# Altium footprint library IC.PcbLib: 115 footprints (part 7 of 8)
Each footprint in its own frame and in the unit in brackets; x right, y up, seen from the top. Pads: shape width x height; smd on the part's side, far side on the other; paste and mask are expansions set on the pad; w line width, h text height; cw(c..) or ccw(c..) is an arc to the next point about the centre after c.
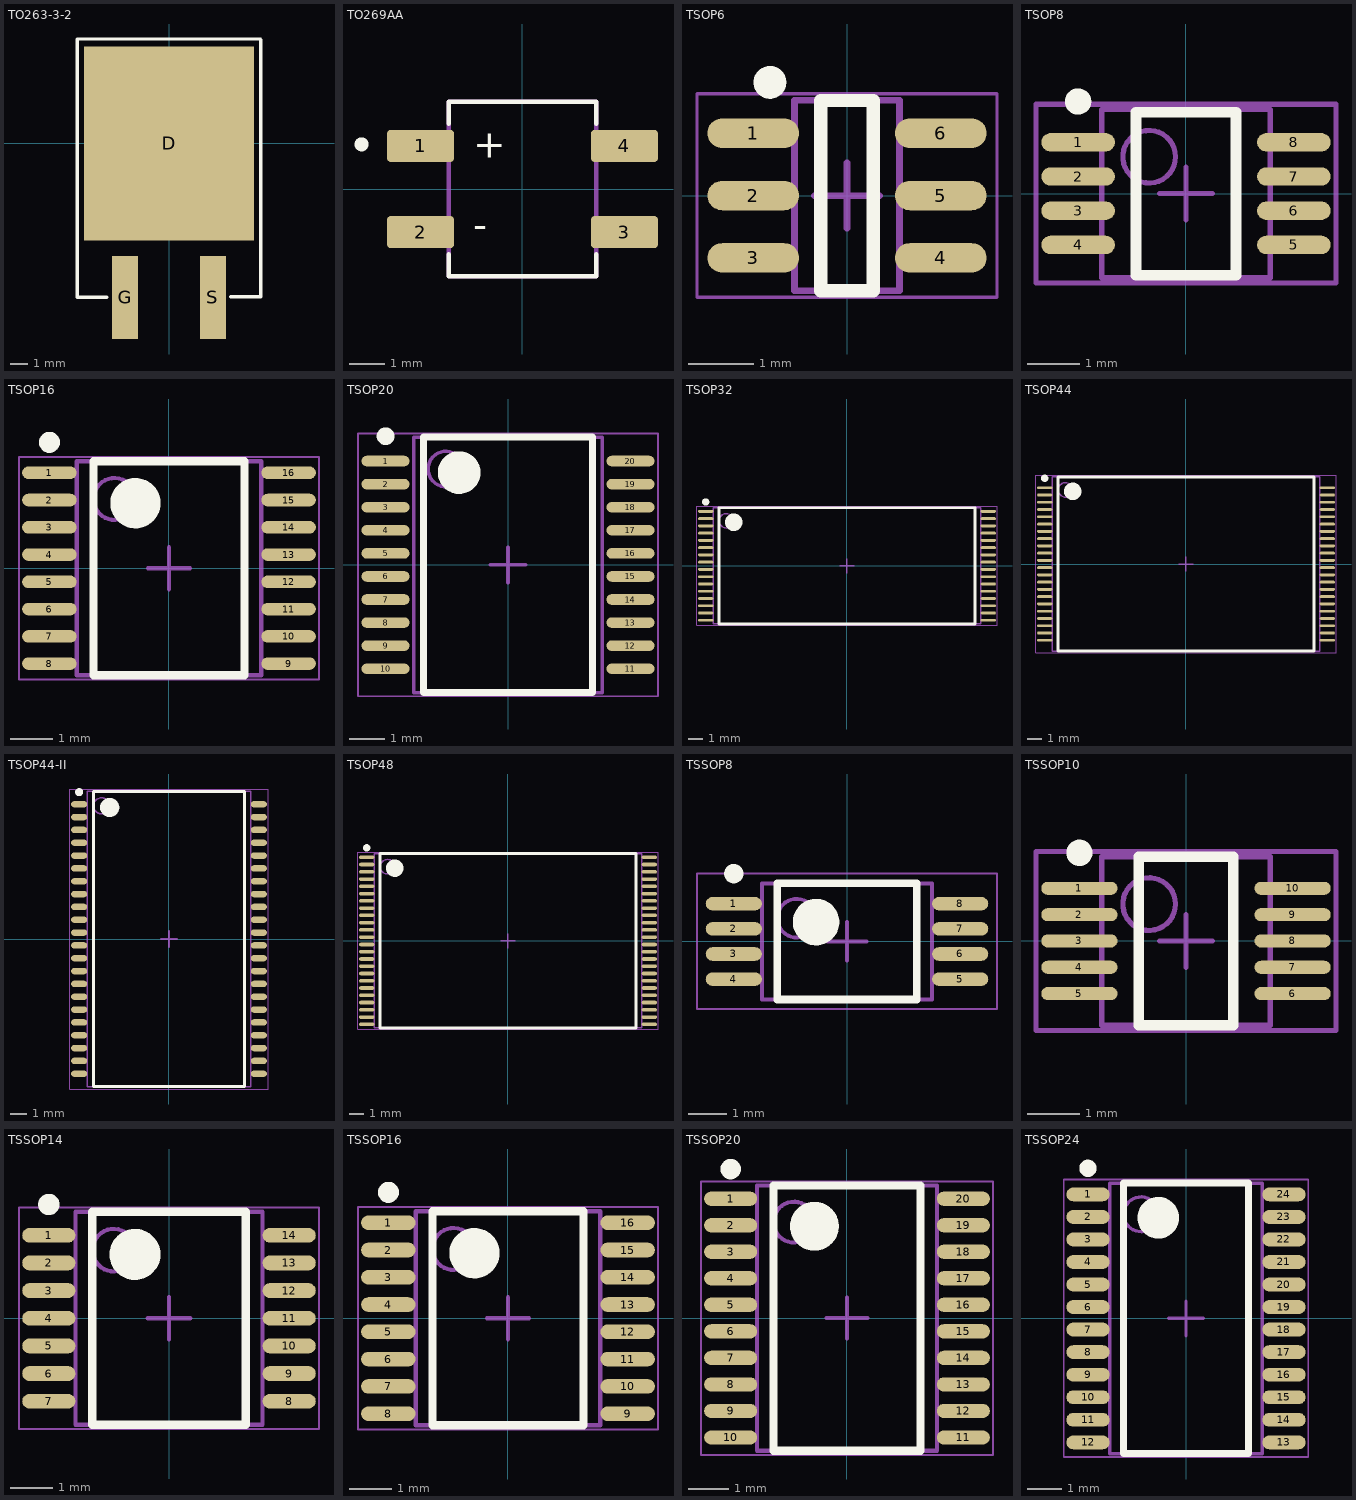
[diagram p6: the footprints below, top view; thin cyan lines are the x and y axes]

## TO263-3-2 [mm]
pads (3):
  rect 9.8x11.2 smd: D(0,0)
  rect 1.524x4.8 smd: G(-2.54,-8.9) S(2.54,-8.9)
Top Overlay:
  lines w0.2: -3.581,-8.89 -5.292,-8.89 -5.292,6.02 5.258,6.02 5.292,5.986 5.292,-8.865 3.573,-8.865
3D body "IRF740S.STEP": height 4.93, standoff -0.03, extent -5.131,-9.982 5.029,5.258

## TO269AA [mm]
pads (4):
  rrect23% 1.91x0.91 smd: 1(-2.9,1.225) 2(-2.9,-1.225) 3(2.9,-1.225) 4(2.9,1.225)
Top Overlay:
  circle w0.2: c-4.58,1.27 r0.1
  lines w0.127: -2.1,-1.86 -2.1,-2.48 2.1,-2.48 2.1,-1.86 ; -2.1,1.86 -2.1,2.48 2.1,2.48 2.1,1.86
  text "+" at -1.399,0.89 h0.81
  text "-" at -1.4,-1.4 h0.81
Mechanical 13:
  lines w0.127: -2.1,-2.48 2.1,-2.48 2.1,2.48 -2.1,2.48 -2.1,-2.48
3D body "User Library-TO-269AA_jam.step": height 2.7, standoff 0, extent -3.571,-2.438 3.469,2.512

## TSOP6 [mm] "TSOP, 6-Leads, Body 2.90x1.63mm, Pitch 0.95mm, IPC High Density"
height 1
pads (6):
  oval 1.4x0.45 smd: 1(-1.429,0.95) 2(-1.429,0) 3(-1.429,-0.95) 4(1.429,-0.95) 5(1.429,0) 6(1.429,0.95)
Top Overlay:
  circle w0.25: c-1.175,1.725 r0.125
  lines w0.2: -0.4,-1.45 0.4,-1.45 0.4,1.45 -0.4,1.45 -0.4,-1.45
Mechanical 13:
  lines w0.1: -0.8,-1.45 0.8,-1.45 0.8,1.45 -0.8,1.45 -0.8,-1.45
Mechanical 15:
  lines w0.05: -2.286,-1.55 2.286,-1.55 2.286,1.55 -2.286,1.55 -2.286,-1.55
  lines w0.1: -0.5,0 0.5,0 ; 0,-0.5 0,0.5
3D body "User Library-TSOP6.step": height 1.04, standoff -0.01, extent -1.375,-1.5 1.375,1.5

## TSOP8 [mm] "TSOP, 8-Leads, Body 3x3mm, Pitch 0.65mm, IPC High Density"
height 1.1
pads (8):
  oval 1.4x0.35 smd: 1(-2.05,0.975) 2(-2.05,0.325) 3(-2.05,-0.325) 4(-2.05,-0.975) 5(2.05,-0.975) 6(2.05,-0.325) 7(2.05,0.325) 8(2.05,0.975)
Top Overlay:
  circle w0.25: c-2.05,1.75 r0.125
  lines w0.2: -0.95,-1.55 -0.95,1.55 0.95,1.55 0.95,-1.55 -0.95,-1.55
Mechanical 13:
  circle w0.1: c-0.7,0.7 r0.5
  lines w0.1: -1.6,-1.6 -1.6,1.6 1.6,1.6 1.6,-1.6 -1.6,-1.6
Mechanical 15:
  lines w0.1: -0.5,0 0.5,0 ; 0,-0.5 0,0.5 ; -2.85,-1.7 -2.85,1.7 2.85,1.7 2.85,-1.7 -2.85,-1.7
3D body "TSOP65P470X150-8N.step": height 1.5, standoff 0, extent -2.35,-1.5 2.35,1.5

## TSOP16 [mm] "TSOP, 16-Leads, Body 5.10x4.40mm, Pitch 0.65mm, IPC High Density"
height 1
pads (16):
  oval 1.3x0.3 smd: 1(-2.85,2.275) 2(-2.85,1.625) 3(-2.85,0.975) 4(-2.85,0.325) 5(-2.85,-0.325) 6(-2.85,-0.975) 7(-2.85,-1.625) 8(-2.85,-2.275) 9(2.85,-2.275) 10(2.85,-1.625) 11(2.85,-0.975) 12(2.85,-0.325) 13(2.85,0.325) 14(2.85,0.975) 15(2.85,1.625) 16(2.85,2.275)
Top Overlay:
  circle w0.6: c-0.8,1.55 r0.3
  circle w0.25: c-2.85,3 r0.125
  lines w0.2: -1.8,-2.55 1.8,-2.55 1.8,2.55 -1.8,2.55 -1.8,-2.55
Mechanical 13:
  circle w0.1: c-1.3,1.65 r0.5
  lines w0.1: -2.2,-2.55 2.2,-2.55 2.2,2.55 -2.2,2.55 -2.2,-2.55
Mechanical 15:
  lines w0.05: -3.575,-2.65 3.575,-2.65 3.575,2.65 -3.575,2.65 -3.575,-2.65
  lines w0.1: -0.5,0 0.5,0 ; 0,-0.5 0,0.5
3D body "TSOP65P640X150-16N.step": height 1.5, standoff 0, extent -3.19,-2.6 3.19,2.6

## TSOP20 [mm] "TSOP, 20-Leads, Body 7.20x5.30mm, Pitch 0.65mm, IPC High Density"
height 1
pads (20):
  oval 1.35x0.3 smd: 1(-3.45,2.925) 2(-3.45,2.275) 3(-3.45,1.625) 4(-3.45,0.975) 5(-3.45,0.325) 6(-3.45,-0.325) 7(-3.45,-0.975) 8(-3.45,-1.625) 9(-3.45,-2.275) 10(-3.45,-2.925) 11(3.45,-2.925) 12(3.45,-2.275) 13(3.45,-1.625) 14(3.45,-0.975) 15(3.45,-0.325) 16(3.45,0.325) 17(3.45,0.975) 18(3.45,1.625) 19(3.45,2.275) 20(3.45,2.925)
Top Overlay:
  circle w0.25: c-3.45,3.625 r0.125
  circle w0.6: c-1.375,2.6 r0.3
  lines w0.2: -2.375,-3.6 -2.375,3.6 2.375,3.6 2.375,-3.6 -2.375,-3.6
Mechanical 13:
  circle w0.1: c-1.75,2.7 r0.5
  lines w0.1: -2.65,-3.6 -2.65,3.6 2.65,3.6 2.65,-3.6 -2.65,-3.6
Mechanical 15:
  lines w0.05: -4.225,-3.7 -4.225,3.7 4.225,3.7 4.225,-3.7 -4.225,-3.7
  lines w0.1: -0.5,0 0.5,0 ; 0,-0.5 0,0.5
3D body "TSOP65P770X150-20N.step": height 1.5, standoff 0, extent -3.85,-3.6 3.85,3.6

## TSOP32 [mm] "TSOP, 32-Leads, Body 8.00x18.40mm, Pitch 0.50mm, IPC High Density"
height 1.1
pads (32):
  oval 1.05x0.2 smd: 1(-9.725,3.75) 2(-9.725,3.25) 3(-9.725,2.75) 4(-9.725,2.25) 5(-9.725,1.75) 6(-9.725,1.25) 7(-9.725,0.75) 8(-9.725,0.25) 9(-9.725,-0.25) 10(-9.725,-0.75) 11(-9.725,-1.25) 12(-9.725,-1.75) 13(-9.725,-2.25) 14(-9.725,-2.75) 15(-9.725,-3.25) 16(-9.725,-3.75) 17(9.725,-3.75) 18(9.725,-3.25) 19(9.725,-2.75) 20(9.725,-2.25) 21(9.725,-1.75) 22(9.725,-1.25) 23(9.725,-0.75) 24(9.725,-0.25) 25(9.725,0.25) 26(9.725,0.75) 27(9.725,1.25) 28(9.725,1.75) 29(9.725,2.25) 30(9.725,2.75) 31(9.725,3.25) 32(9.725,3.75)
Top Overlay:
  circle w0.25: c-9.725,4.4 r0.125
  circle w0.6: c-7.8,3 r0.3
  lines w0.2: -8.8,-4 -8.8,4 8.8,4 8.8,-4 -8.8,-4
Mechanical 13:
  circle w0.1: c-8.3,3.1 r0.5
  lines w0.1: -9.2,-4 -9.2,4 9.2,4 9.2,-4 -9.2,-4
Mechanical 15:
  lines w0.05: -10.325,-4.1 -10.325,4.1 10.325,4.1 10.325,-4.1 -10.325,-4.1
  lines w0.1: -0.5,0 0.5,0 ; 0,-0.5 0,0.5
3D body "TSSOP50P2000X150-32N.step": height 1.5, standoff 0, extent -10,-4 10,4

## TSOP44 [mm] "TSOP, 44-Leads, Body 12.00x18.40mm, Pitch 0.50mm, IPC High Density"
height 1.2
pads (44):
  oval 1.05x0.2 smd: 1(-9.725,5.25) 2(-9.725,4.75) 3(-9.725,4.25) 4(-9.725,3.75) 5(-9.725,3.25) 6(-9.725,2.75) 7(-9.725,2.25) 8(-9.725,1.75) 9(-9.725,1.25) 10(-9.725,0.75) 11(-9.725,0.25) 12(-9.725,-0.25) 13(-9.725,-0.75) 14(-9.725,-1.25) 15(-9.725,-1.75) 16(-9.725,-2.25) 17(-9.725,-2.75) 18(-9.725,-3.25) 19(-9.725,-3.75) 20(-9.725,-4.25) 21(-9.725,-4.75) 22(-9.725,-5.25) 23(9.725,-5.25) 24(9.725,-4.75) 25(9.725,-4.25) 26(9.725,-3.75) 27(9.725,-3.25) 28(9.725,-2.75) 29(9.725,-2.25) 30(9.725,-1.75) 31(9.725,-1.25) 32(9.725,-0.75) 33(9.725,-0.25) 34(9.725,0.25) 35(9.725,0.75) 36(9.725,1.25) 37(9.725,1.75) 38(9.725,2.25) 39(9.725,2.75) 40(9.725,3.25) 41(9.725,3.75) 42(9.725,4.25) 43(9.725,4.75) 44(9.725,5.25)
Top Overlay:
  circle w0.6: c-7.8,5 r0.3
  circle w0.25: c-9.725,5.9 r0.125
  lines w0.2: -8.8,-6 8.8,-6 8.8,6 -8.8,6 -8.8,-6
Mechanical 13:
  circle w0.1: c-8.3,5.1 r0.5
  lines w0.1: -9.2,-6 9.2,-6 9.2,6 -9.2,6 -9.2,-6
Mechanical 15:
  lines w0.05: -10.325,-6.1 10.325,-6.1 10.325,6.1 -10.325,6.1 -10.325,-6.1
  lines w0.1: -0.5,0 0.5,0 ; 0,-0.5 0,0.5
3D body "TSSOP50P2000X150-44N.step": height 1.5, standoff 0, extent -10,-6 10,6

## TSOP44-II [mm] "TSOP-II, 44-Leads, Body 18.41x10.16mm, Pitch 0.80mm, IPC High Density"
height 1.2
pads (44):
  oval 1x0.4 smd: 1(-5.6,8.4) 2(-5.6,7.6) 3(-5.6,6.8) 4(-5.6,6) 5(-5.6,5.2) 6(-5.6,4.4) 7(-5.6,3.6) 8(-5.6,2.8) 9(-5.6,2) 10(-5.6,1.2) 11(-5.6,0.4) 12(-5.6,-0.4) 13(-5.6,-1.2) 14(-5.6,-2) 15(-5.6,-2.8) 16(-5.6,-3.6) 17(-5.6,-4.4) 18(-5.6,-5.2) 19(-5.6,-6) 20(-5.6,-6.8) 21(-5.6,-7.6) 22(-5.6,-8.4) 23(5.6,-8.4) 24(5.6,-7.6) 25(5.6,-6.8) 26(5.6,-6) 27(5.6,-5.2) 28(5.6,-4.4) 29(5.6,-3.6) 30(5.6,-2.8) 31(5.6,-2) 32(5.6,-1.2) 33(5.6,-0.4) 34(5.6,0.4) 35(5.6,1.2) 36(5.6,2) 37(5.6,2.8) 38(5.6,3.6) 39(5.6,4.4) 40(5.6,5.2) 41(5.6,6) 42(5.6,6.8) 43(5.6,7.6) 44(5.6,8.4)
Top Overlay:
  circle w0.25: c-5.6,9.15 r0.125
  circle w0.6: c-3.7,8.2 r0.3
  lines w0.2: -4.7,-9.2 -4.7,9.2 4.7,9.2 4.7,-9.2 -4.7,-9.2
Mechanical 13:
  circle w0.1: c-4.2,8.3 r0.5
  lines w0.1: -5.1,-9.2 -5.1,9.2 5.1,9.2 5.1,-9.2 -5.1,-9.2
Mechanical 15:
  lines w0.05: -6.2,-9.35 -6.2,9.35 6.2,9.35 6.2,-9.35 -6.2,-9.35
  lines w0.1: -0.5,0 0.5,0 ; 0,-0.5 0,0.5
3D body "User Library-IPC SO (1).step": height 1.35, standoff 0, extent -5.908,-9.27 5.908,9.27

## TSOP48 [mm] "TSOP, 48-Leads, Body 12.00x18.40mm, Pitch 0.50mm, IPC High Density"
height 1
pads (48):
  oval 1.05x0.25 smd: 1(-9.725,5.75) 2(-9.725,5.25) 3(-9.725,4.75) 4(-9.725,4.25) 5(-9.725,3.75) 6(-9.725,3.25) 7(-9.725,2.75) 8(-9.725,2.25) 9(-9.725,1.75) 10(-9.725,1.25) 11(-9.725,0.75) 12(-9.725,0.25) 13(-9.725,-0.25) 14(-9.725,-0.75) 15(-9.725,-1.25) 16(-9.725,-1.75) 17(-9.725,-2.25) 18(-9.725,-2.75) 19(-9.725,-3.25) 20(-9.725,-3.75) 21(-9.725,-4.25) 22(-9.725,-4.75) 23(-9.725,-5.25) 24(-9.725,-5.75) 25(9.725,-5.75) 26(9.725,-5.25) 27(9.725,-4.75) 28(9.725,-4.25) 29(9.725,-3.75) 30(9.725,-3.25) 31(9.725,-2.75) 32(9.725,-2.25) 33(9.725,-1.75) 34(9.725,-1.25) 35(9.725,-0.75) 36(9.725,-0.25) 37(9.725,0.25) 38(9.725,0.75) 39(9.725,1.25) 40(9.725,1.75) 41(9.725,2.25) 42(9.725,2.75) 43(9.725,3.25) 44(9.725,3.75) 45(9.725,4.25) 46(9.725,4.75) 47(9.725,5.25) 48(9.725,5.75)
Top Overlay:
  circle w0.25: c-9.725,6.4 r0.125
  circle w0.6: c-7.8,5 r0.3
  lines w0.2: -8.8,-6 -8.8,6 8.8,6 8.8,-6 -8.8,-6
Mechanical 13:
  circle w0.1: c-8.3,5.1 r0.5
  lines w0.1: -9.2,-6 -9.2,6 9.2,6 9.2,-6 -9.2,-6
Mechanical 15:
  lines w0.05: -10.325,-6.1 -10.325,6.1 10.325,6.1 10.325,-6.1 -10.325,-6.1
  lines w0.1: -0.5,0 0.5,0 ; 0,-0.5 0,0.5
3D body "User Library-TSOP48-1.STEP": height 1.2, standoff 0, extent -10.1,-6.05 10.1,6.05

## TSSOP8 [mm] "TSSOP, 8-Leads, Body 3.00x4.40mm, Pitch 0.65mm, IPC Medium Density"
height 1.5
pads (8):
  oval 1.45x0.35 smd: 1(-2.925,0.975) 2(-2.925,0.325) 3(-2.925,-0.325) 4(-2.925,-0.975) 5(2.925,-0.975) 6(2.925,-0.325) 7(2.925,0.325) 8(2.925,0.975)
Top Overlay:
  circle w0.25: c-2.925,1.75 r0.125
  circle w0.6: c-0.8,0.5 r0.3
  lines w0.2: -1.8,-1.5 -1.8,1.5 1.8,1.5 1.8,-1.5 -1.8,-1.5
Mechanical 13:
  circle w0.1: c-1.3,0.6 r0.5
  lines w0.1: -2.2,-1.5 -2.2,1.5 2.2,1.5 2.2,-1.5 -2.2,-1.5
Mechanical 15:
  lines w0.05: -3.875,-1.75 -3.875,1.75 3.875,1.75 3.875,-1.75 -3.875,-1.75
  lines w0.1: -0.5,0 0.5,0 ; 0,-0.5 0,0.5
3D body "User Library-tsop8.step": height 1.2, standoff 0, extent -3.2,-1.55 3.2,1.55

## TSSOP10 [mm] "TSSOP, 10-Leads, Body 3x3mm, Pitch 0.5mm, IPC High Density"
height 1.1
pads (10):
  oval 1.45x0.25 smd: 1(-2.025,1) 2(-2.025,0.5) 3(-2.025,0) 4(-2.025,-0.5) 5(-2.025,-1) 6(2.025,-1) 7(2.025,-0.5) 8(2.025,0) 9(2.025,0.5) 10(2.025,1)
Top Overlay:
  circle w0.25: c-2.025,1.675 r0.125
  lines w0.2: -0.9,-1.6 0.9,-1.6 0.9,1.6 -0.9,1.6 -0.9,-1.6
Mechanical 13:
  circle w0.1: c-0.7,0.7 r0.5
  lines w0.1: -1.6,-1.6 1.6,-1.6 1.6,1.6 -1.6,1.6 -1.6,-1.6
Mechanical 15:
  lines w0.1: -0.5,0 0.5,0 ; 0,-0.5 0,0.5 ; -2.85,-1.7 2.85,-1.7 2.85,1.7 -2.85,1.7 -2.85,-1.7
3D body "User Library-IPC SO.step": height 1.1, standoff 0, extent -2.478,-1.55 2.478,1.55

## TSSOP14 [mm] "TSSOP, 14-Leads, Body 5.00x4.40mm, Pitch 0.65mm, IPC High Density"
height 1
pads (14):
  oval 1.25x0.35 smd: 1(-2.825,1.95) 2(-2.825,1.3) 3(-2.825,0.65) 4(-2.825,0) 5(-2.825,-0.65) 6(-2.825,-1.3) 7(-2.825,-1.95) 8(2.825,-1.95) 9(2.825,-1.3) 10(2.825,-0.65) 11(2.825,0) 12(2.825,0.65) 13(2.825,1.3) 14(2.825,1.95)
Top Overlay:
  circle w0.6: c-0.8,1.5 r0.3
  circle w0.25: c-2.825,2.675 r0.125
  lines w0.2: -1.8,-2.5 1.8,-2.5 1.8,2.5 -1.8,2.5 -1.8,-2.5
Mechanical 13:
  circle w0.1: c-1.3,1.6 r0.5
  lines w0.1: -2.2,-2.5 2.2,-2.5 2.2,2.5 -2.2,2.5 -2.2,-2.5
Mechanical 15:
  lines w0.05: -3.525,-2.6 3.525,-2.6 3.525,2.6 -3.525,2.6 -3.525,-2.6
  lines w0.1: -0.5,0 0.5,0 ; 0,-0.5 0,0.5
3D body "User Library-IPC SO.step": height 1.25, standoff 0, extent -3.228,-2.55 3.228,2.55

## TSSOP16 [mm] "TSSOP, 16-Leads, Body 5.10x4.40mm, Pitch 0.65mm, IPC High Density"
height 1.2
pads (16):
  oval 1.3x0.35 smd: 1(-2.85,2.275) 2(-2.85,1.625) 3(-2.85,0.975) 4(-2.85,0.325) 5(-2.85,-0.325) 6(-2.85,-0.975) 7(-2.85,-1.625) 8(-2.85,-2.275) 9(2.85,-2.275) 10(2.85,-1.625) 11(2.85,-0.975) 12(2.85,-0.325) 13(2.85,0.325) 14(2.85,0.975) 15(2.85,1.625) 16(2.85,2.275)
Top Overlay:
  circle w0.6: c-0.8,1.55 r0.3
  circle w0.25: c-2.85,3 r0.125
  lines w0.2: -1.8,-2.55 1.8,-2.55 1.8,2.55 -1.8,2.55 -1.8,-2.55
Mechanical 13:
  circle w0.1: c-1.3,1.65 r0.5
  lines w0.1: -2.2,-2.55 2.2,-2.55 2.2,2.55 -2.2,2.55 -2.2,-2.55
Mechanical 15:
  lines w0.05: -3.575,-2.65 3.575,-2.65 3.575,2.65 -3.575,2.65 -3.575,-2.65
  lines w0.1: -0.5,0 0.5,0 ; 0,-0.5 0,0.5
3D body "User Library-IPC SO.step": height 1.25, standoff 0, extent -3.228,-2.53 3.228,2.57

## TSSOP20 [mm] "TSSOP, 20-Leads, Body 6.50x4.40mm, Pitch 0.65mm, IPC High Density"
height 1.2
pads (20):
  oval 1.3x0.35 smd: 1(-2.85,2.925) 2(-2.85,2.275) 3(-2.85,1.625) 4(-2.85,0.975) 5(-2.85,0.325) 6(-2.85,-0.325) 7(-2.85,-0.975) 8(-2.85,-1.625) 9(-2.85,-2.275) 10(-2.85,-2.925) 11(2.85,-2.925) 12(2.85,-2.275) 13(2.85,-1.625) 14(2.85,-0.975) 15(2.85,-0.325) 16(2.85,0.325) 17(2.85,0.975) 18(2.85,1.625) 19(2.85,2.275) 20(2.85,2.925)
Top Overlay:
  circle w0.6: c-0.8,2.25 r0.3
  circle w0.25: c-2.85,3.65 r0.125
  lines w0.2: -1.8,-3.25 1.8,-3.25 1.8,3.25 -1.8,3.25 -1.8,-3.25
Mechanical 13:
  circle w0.1: c-1.3,2.35 r0.5
  lines w0.1: -2.2,-3.25 2.2,-3.25 2.2,3.25 -2.2,3.25 -2.2,-3.25
Mechanical 15:
  lines w0.05: -3.575,-3.35 3.575,-3.35 3.575,3.35 -3.575,3.35 -3.575,-3.35
  lines w0.1: -0.5,0 0.5,0 ; 0,-0.5 0,0.5
3D body "User Library-IPC SO.step": height 1.25, standoff 0, extent -3.228,-3.3 3.228,3.3

## TSSOP24 [mm] "TSSOP, 24-Leads, Body 7.80x4.40mm, Pitch 0.65mm, IPC High Density"
height 1.1
pads (24):
  oval 1.25x0.4 smd: 1(-2.825,3.575) 2(-2.825,2.925) 3(-2.825,2.275) 4(-2.825,1.625) 5(-2.825,0.975) 6(-2.825,0.325) 7(-2.825,-0.325) 8(-2.825,-0.975) 9(-2.825,-1.625) 10(-2.825,-2.275) 11(-2.825,-2.925) 12(-2.825,-3.575) 13(2.825,-3.575) 14(2.825,-2.925) 15(2.825,-2.275) 16(2.825,-1.625) 17(2.825,-0.975) 18(2.825,-0.325) 19(2.825,0.325) 20(2.825,0.975) 21(2.825,1.625) 22(2.825,2.275) 23(2.825,2.925) 24(2.825,3.575)
Top Overlay:
  circle w0.25: c-2.825,4.325 r0.125
  circle w0.6: c-0.8,2.9 r0.3
  lines w0.2: -1.8,-3.9 -1.8,3.9 1.8,3.9 1.8,-3.9 -1.8,-3.9
Mechanical 13:
  circle w0.1: c-1.3,3 r0.5
  lines w0.1: -2.2,-3.9 -2.2,3.9 2.2,3.9 2.2,-3.9 -2.2,-3.9
Mechanical 15:
  lines w0.05: -3.525,-4 -3.525,4 3.525,4 3.525,-4 -3.525,-4
  lines w0.1: -0.5,0 0.5,0 ; 0,-0.5 0,0.5
3D body "User Library-IPC SO.step": height 1.25, standoff 0, extent -3.228,-3.95 3.228,3.95